# Altium footprint library Footprints.PcbLib: 104 footprints (part 2 of 7)
Each footprint in its own frame and in the unit in brackets; x right, y up, seen from the top. Pads: shape width x height; smd on the part's side, far side on the other; paste and mask are expansions set on the pad; w line width, h text height; cw(c..) or ccw(c..) is an arc to the next point about the centre after c.
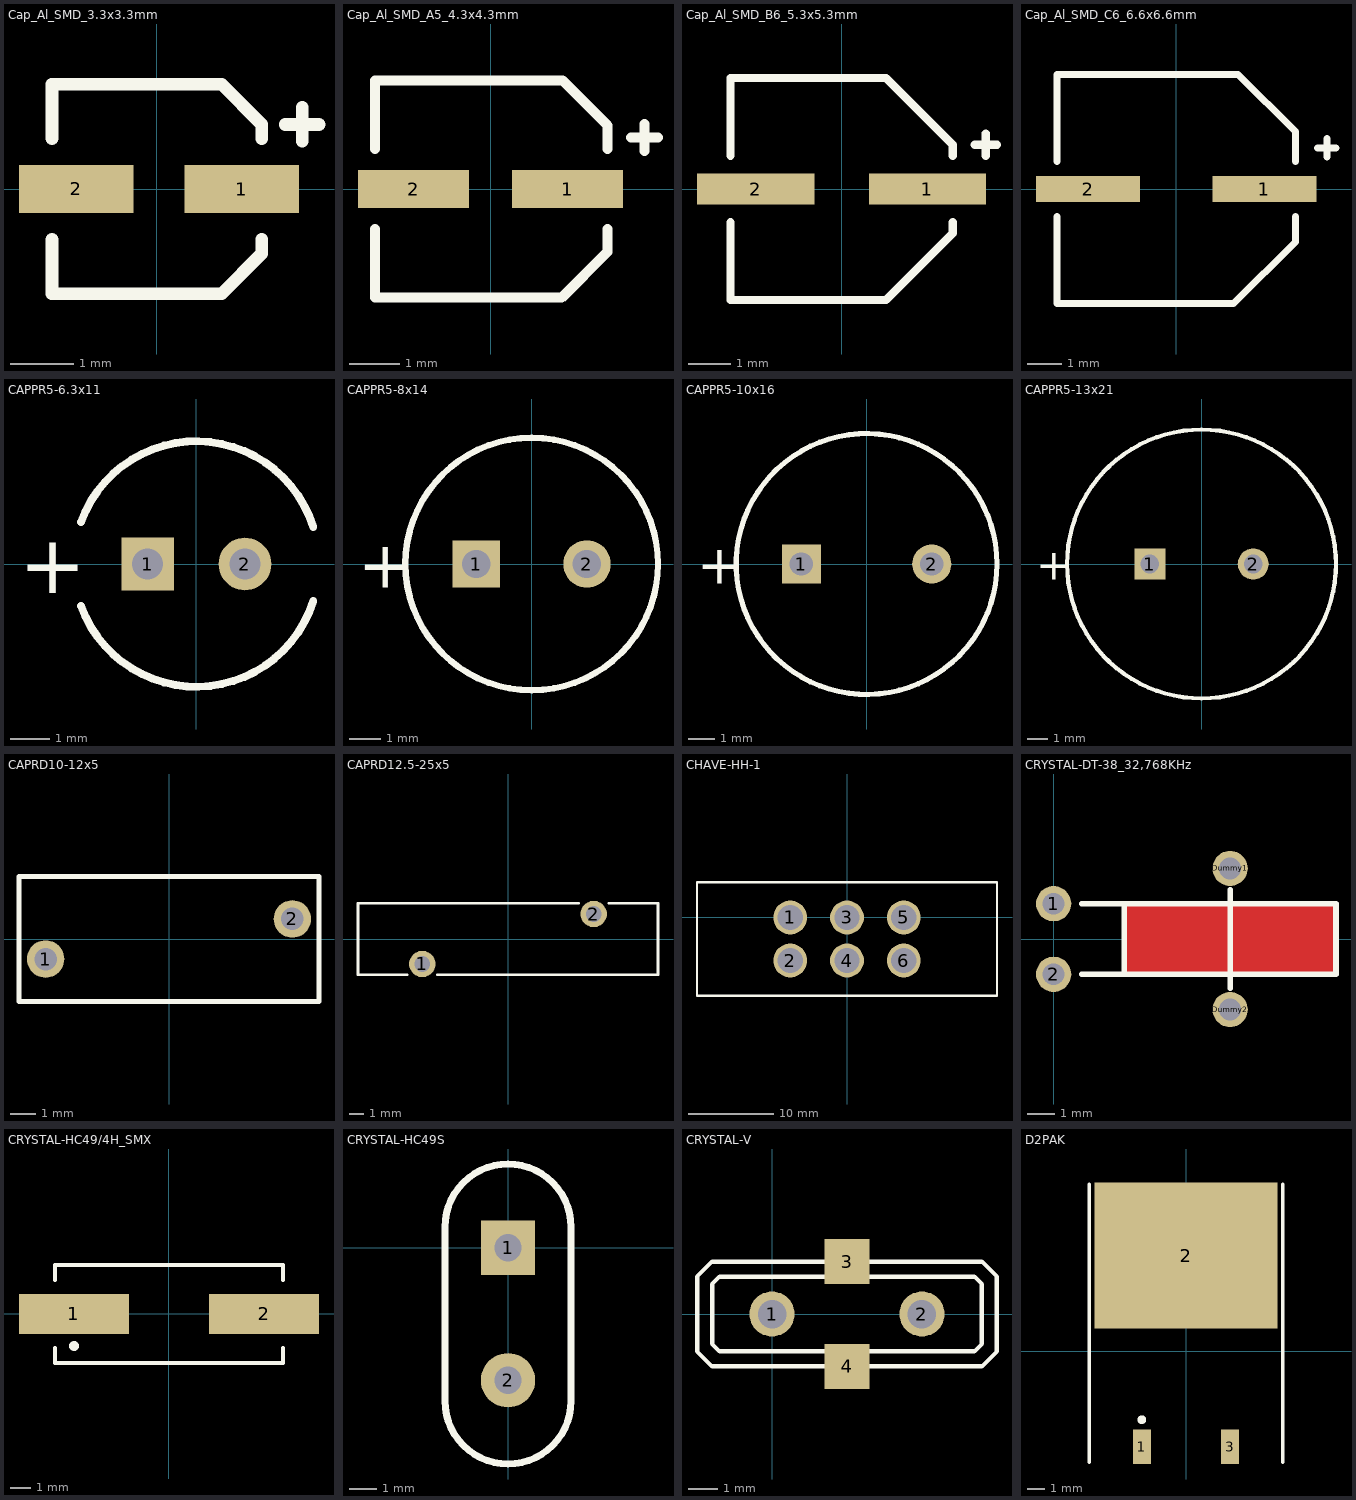
[diagram p1: the footprints below, top view; thin cyan lines are the x and y axes]

## Cap_Al_SMD_3.3x3.3mm [mm]
height 5.5
pads (2):
  rect 1.8x0.75 smd: 1(1.333,0) 2(-1.27,0)
Top Overlay:
  lines w0.2: -1.65,-0.795 -1.65,-1.65 1.016,-1.65 1.65,-1.016 1.65,-0.795 ; -1.65,0.795 -1.65,1.65 1.017,1.65 1.65,1.017 1.65,0.795 ; 2.021,1.016 2.551,1.016 ; 2.286,0.751 2.286,1.281
3D body: height 5.1, standoff 0.1, extent -1.494,-1.497 1.494,1.497
3D body: height 0.3, standoff 0.05, extent -1.65,-1.65 1.65,1.65

## Cap_Al_SMD_A5_4.3x4.3mm [mm]
height 5.5
pads (2):
  rect 2.2x0.75 smd: 1(1.524,0) 2(-1.524,0)
Top Overlay:
  lines w0.2: -2.286,-0.795 -2.286,-2.15 1.406,-2.15 2.314,-1.242 2.314,-0.795 ; -2.286,0.795 -2.286,2.15 1.424,2.15 2.314,1.26 2.314,0.795 ; 2.783,1.016 3.313,1.016 ; 3.048,0.751 3.048,1.281
3D body "User Library-CAPSMD4x3_9.STEP": height 3.91, standoff 0, extent -2.286,-2.15 2.314,2.15

## Cap_Al_SMD_B6_5.3x5.3mm [mm]
height 6
pads (2):
  rect 2.8x0.75 smd: 1(2.05,0) 2(-2.05,0)
Top Overlay:
  lines w0.2: -2.65,-0.795 -2.65,-2.65 1.06,-2.65 2.65,-1.06 2.65,-0.795 ; -2.65,0.795 -2.65,2.65 1.06,2.65 2.65,1.06 2.65,0.795 ; 3.18,1.06 3.71,1.06 ; 3.445,0.795 3.445,1.325
3D body "Cap-Al-SizeC.step": height 6.42, standoff 0, extent -3,-2.65 3,2.65

## Cap_Al_SMD_C6_6.6x6.6mm [mm]
height 6
pads (2):
  rect 3x0.75 smd: 1(2.54,0) 2(-2.54,0)
Top Overlay:
  lines w0.2: -3.429,-0.795 -3.429,-3.3 1.653,-3.3 3.429,-1.524 3.429,-0.795 ; -3.429,0.795 -3.429,3.3 1.78,3.3 3.429,1.651 3.429,0.795 ; 4.069,1.187 4.599,1.187 ; 4.334,0.922 4.334,1.452
3D body "User Library-SMD Polymer Aluminum Electrolytic Capacitors C6 47uF 10V.step": height 5.9, standoff -0.05, extent -3.65,-3.3 3.65,3.3

## CAPPR5-6.3x11 [mm] "Capacitor, Electrolytic, Radial; Body 6.3 x 11 mm (Dia.xH typ)"
height 11
pads (2):
  rect 1.35x1.35 hole 0.8: 1(-1.25,0)
  round 1.35 hole 0.8: 2(1.25,0)
Top Overlay:
  lines w0.2: -2.961,-1.075 ccw(c0,0) 3.003,-0.95 ; -2.961,1.075 cw(c0,0) 3.003,0.95
  text "+" at -4.55,-0.75 h1.5
3D body "User Library-Cap electrolitic radial 6,3x11.STEP": height 11.2, standoff -1.3, extent -3.123,-3.175 3.175,3.124

## CAPPR5-8x14 [mm] "Capacitor, Electrolytic, Radial; Body 8 x 14 mm (Dia.xH typ)"
height 14
pads (2):
  rect 1.5x1.5 hole 0.9: 1(-1.75,0)
  round 1.5 hole 0.9: 2(1.75,0)
Top Overlay:
  circle w0.2: c0,0 r4
  text "+" at -5.5,-0.752 h1.5
3D body "User Library-Cap electrolitic radial 8x14.STEP": height 14.2, standoff -1.3, extent -3.998,-4 3.999,3.998

## CAPPR5-10x16 [mm] "Capacitor, Electrolytic, Radial; Body 10 x 16 mm (Dia.xH typ)"
height 16
pads (2):
  rect 1.5x1.5 hole 0.9: 1(-2.5,0)
  round 1.5 hole 0.9: 2(2.5,0)
Top Overlay:
  circle w0.2: c0,0 r5
  text "+" at -6.5,-0.752 h1.5
3D body "User Library-Cap electrolitic radial 10x16.STEP": height 16.2, standoff -1.3, extent -4.998,-4.998 4.998,4.998

## CAPPR5-13x21 [mm] "Capacitor, Electrolytic, Radial; Body 13 x 21 mm (Dia.xH typ)"
height 21
pads (2):
  rect 1.5x1.5 hole 0.9: 1(-2.5,0)
  round 1.5 hole 0.9: 2(2.5,0)
Top Overlay:
  circle w0.2: c0,0 r6.5
  text "+" at -8,-0.752 h1.5
3D body "User Library-Cap electrolitic radial 13x21.STEP": height 21.2, standoff -1.3, extent -6.498,-6.5 6.498,6.499

## CAPRD10-12x5 [mm] "Capacitor, Ceramic, Thru-Hole, Disc; Body 12 x 5 mm (LxW max) Pin Spacing 10 mm (typ)"
height 15
pads (2):
  round 1.5 hole 0.9: 1(-4.936,-0.8) 2(4.936,0.8)
Top Overlay:
  lines w0.2: -6,-2.5 6,-2.5 6,2.5 -6,2.5 -6,-2.5

## CAPRD12.5-25x5 [mm] "Capacitor, Ceramic, Thru-Hole, Disc; Body 25 x 5 mm (LxW max) Pin Spacing 12.5 mm (typ)"
height 28
pads (2):
  round 1.85 hole 1.1: 1(-6,-1.75) 2(6,1.75)
Top Overlay:
  lines w0.2: -7.07,-2.5 -10.5,-2.5 -10.5,2.5 4.93,2.5 ; -4.93,-2.5 10.5,-2.5 10.5,2.5 7.07,2.5

## CHAVE-HH-1 [mm]
height 8.5
pads (6):
  round 4 hole 3: 1(-6.7,0) 2(-6.7,-5.08) 3(0,0) 4(0,-5.08) 5(6.7,0) 6(6.7,-5.08)
Top Overlay:
  lines w0.254: -17.7,-9.24 17.7,-9.24 17.7,4.16 -17.7,4.16 -17.7,-9.24

## CRYSTAL-DT-38_32,768KHz [mil]
pads (4):
  round 50 hole 31: 1(0,50) 2(0,-50) Dummy1(250,100) Dummy2(250,-100)
Top Layer:
  region: 100,-50 400,-50 400,50 100,50
Top Overlay:
  lines w8: 40,-50 400,-50 400,50 40,50 ; 100,-50 100,50 ; 250,-70 250,70
3D body "User Library-Cristal_Radial_6x1mm.STEP": height 78.74, standoff 0, extent -18.11,-55.12 336.22,55.12

## CRYSTAL-HC49/4H_SMX [mm] "Quartz Crystal, SM; Body 13.4 (inc. leads) x 4.9 mm (LxW max)"
height 4.3
pads (2):
  rect 5.5x2 smd: 1(-4.75,0) 2(4.75,0)
Top Overlay:
  circle w0.25: c-4.75,-1.6 r0.125
  lines w0.2: -5.7,-1.7 -5.7,-2.45 5.7,-2.45 5.7,-1.7 ; -5.7,1.7 -5.7,2.45 5.7,2.45 5.7,1.7
3D body "Crystal HC49S SMT.step": height 4.32, standoff 0.02, extent -6.6,-2.4 6.6,2.4

## CRYSTAL-HC49S [mm]
pads (2):
  rect 2x2 hole 1: 1(0,0)
  round 2 hole 1: 2(0,-4.88)
Top Overlay:
  lines w0.254: -2.32,-5.64 ccw(c0,-5.64) 0,-7.96 ccw(c0,-5.64) 2.32,-5.64 2.32,0.76 ccw(c0,0.76) 0,3.08 ccw(c0,0.76) -2.32,0.76 -2.32,-5.64
3D body "Crystal HC49S.step": height 3.52, standoff -3.98, extent -2.337,-8.12 2.313,3.23

## CRYSTAL-V [mil]
pads (4):
  round 60 hole 38: 1(0,0) 2(200,0)
  rect 60x60 smd: 3(100,70) 4(100,-70)
Top Overlay:
  lines w6: -100,-50 -100,50 -80,70 -30,70 240,70 280,70 300,50 300,-50 280,-70 240,-70 -40,-70 -80,-70 -100,-50 ; -80,-40 -70,-50 -30,-50 230,-50 270,-50 280,-40 280,40 270,50 230,50 -30,50 -70,50 -80,40 -80,-40
3D body "SW3dPS-XTAL2.STEP": height 121.8, standoff -100, extent -110,-59.99 310,60.01

## D2PAK [mm] "D2-PAK/TO-263-AB; 3 Leads (1 Cropped); Body 15.5 (inc. leads) x 10.5 mm (LxW max)"
height 4.69
pads (3):
  rect 1.05x2 smd: 1(-2.54,-5.5) 3(2.54,-5.5)
  rect 10.55x8.4 smd: 2(0,5.5)
Top Overlay:
  circle w0.25: c-2.54,-3.95 r0.125
  lines w0.2: -5.575,-6.4 -5.575,9.6 ; 5.575,-6.4 5.575,9.6
3D body "User Library-DPAK.step": height 4.98, standoff -0.03, extent -5.105,-6.089 5.055,9.175